# Altium footprint library Intelliclone.PcbLib: 372 footprints (part 3 of 24)
Each footprint in its own frame and in the unit in brackets; x right, y up, seen from the top. Pads: shape width x height; smd on the part's side, far side on the other; paste and mask are expansions set on the pad; w line width, h text height; cw(c..) or ccw(c..) is an arc to the next point about the centre after c.
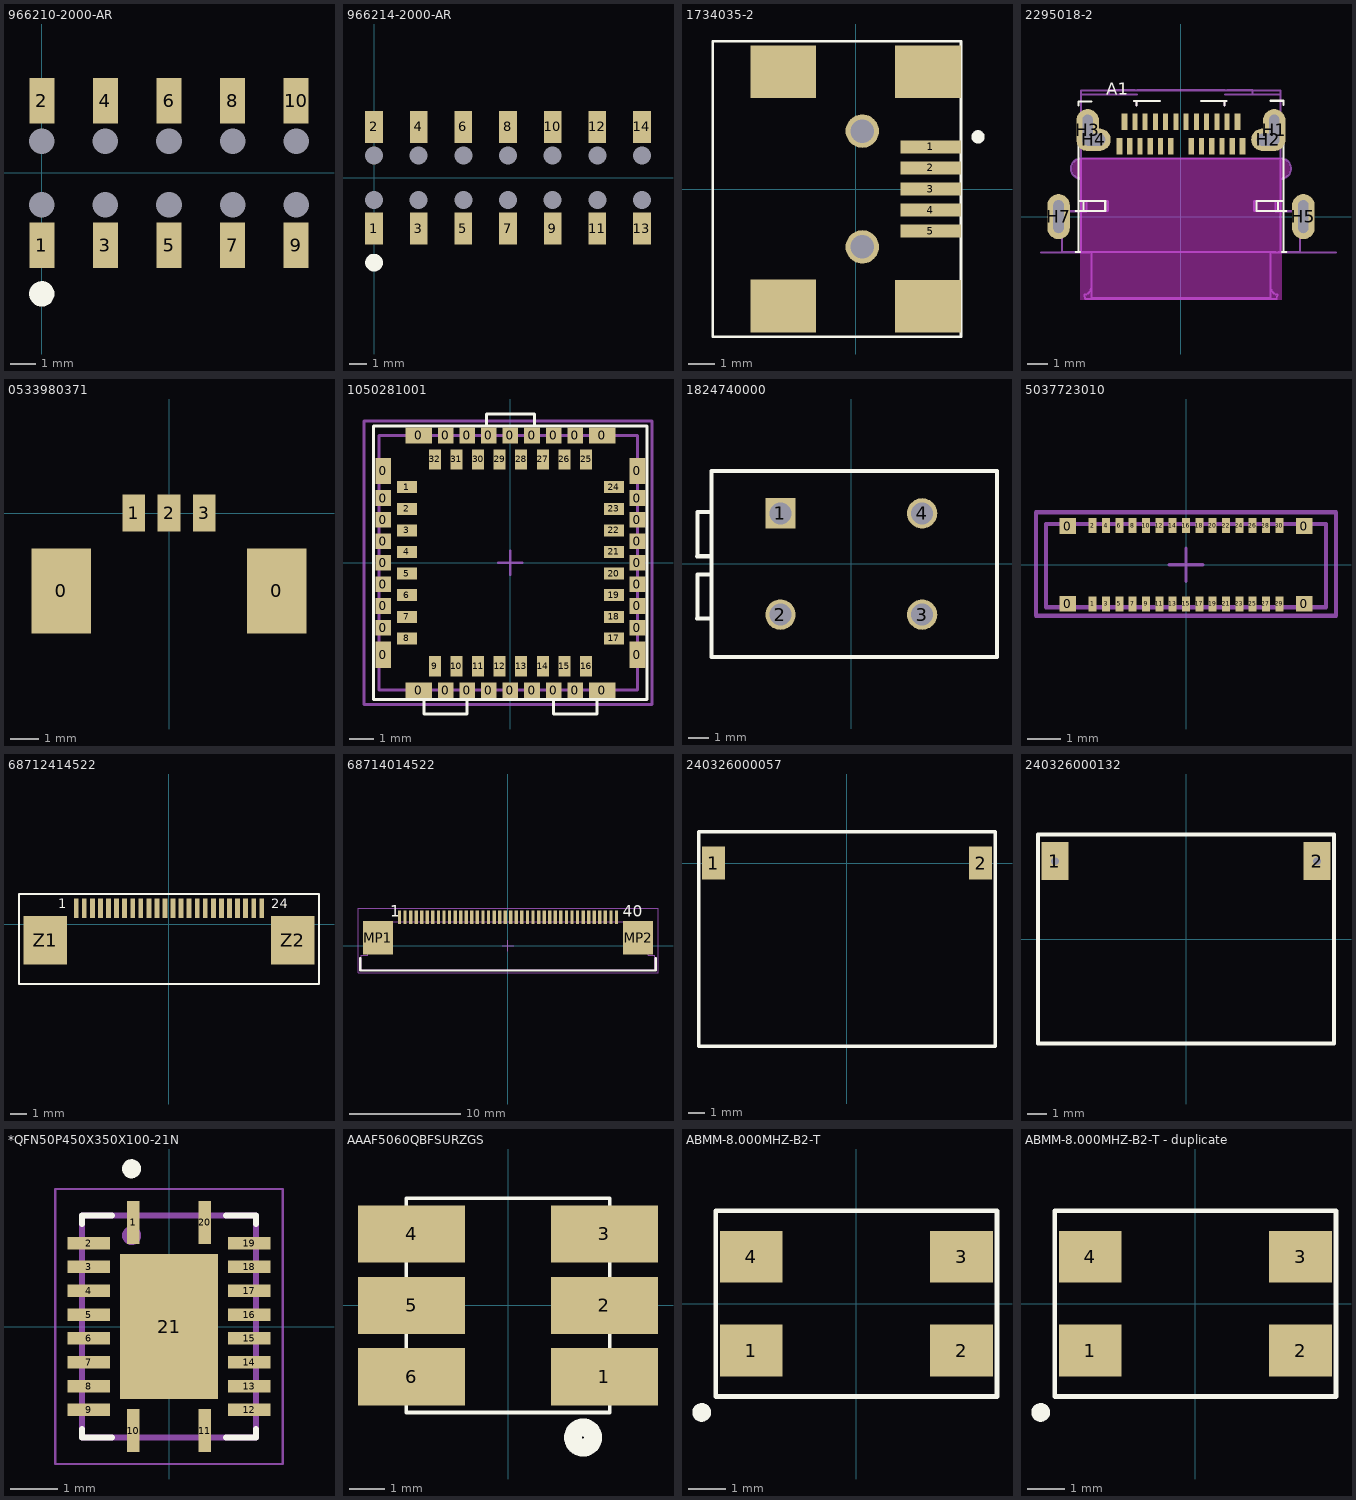
[diagram p2: the footprints below, top view; thin cyan lines are the x and y axes]

## 966210-2000-AR [mm]
pads (30):
  rect 0x0 hole 1.02 unplated: 0(0,-1.27) 0(0,-1.27) 0(0,1.27) 0(0,1.27) 0(2.54,-1.27) 0(2.54,-1.27) 0(2.54,1.27) 0(2.54,1.27) 0(5.08,-1.27) 0(5.08,-1.27) 0(5.08,1.27) 0(5.08,1.27) 0(7.62,-1.27) 0(7.62,-1.27) 0(7.62,1.27) 0(7.62,1.27) 0(10.16,-1.27) 0(10.16,-1.27) 0(10.16,1.27) 0(10.16,1.27)
  rect 1x1.82 smd: 1(0,-2.89) 2(0,2.89) 3(2.54,-2.89) 4(2.54,2.89) 5(5.08,-2.89) 6(5.08,2.89) 7(7.62,-2.89) 8(7.62,2.89) 9(10.16,-2.89) 10(10.16,2.89)
Top Overlay:
  circle w0.5: c0,-4.826 r0.254
3D body "HLE-105-02-G-DV-BE.stp": height 3.71, standoff 0.05, extent -1.27,-3.289 11.43,3.289

## 966214-2000-AR [mm]
pads (42):
  rect 0x0 hole 1.02 unplated: 0(0,-1.27) 0(0,-1.27) 0(0,1.27) 0(0,1.27) 0(2.54,-1.27) 0(2.54,-1.27) 0(2.54,1.27) 0(2.54,1.27) 0(5.08,-1.27) 0(5.08,-1.27) 0(5.08,1.27) 0(5.08,1.27) 0(7.62,-1.27) 0(7.62,-1.27) 0(7.62,1.27) 0(7.62,1.27) 0(10.16,-1.27) 0(10.16,-1.27) 0(10.16,1.27) 0(10.16,1.27) 0(12.7,-1.27) 0(12.7,-1.27) 0(12.7,1.27) 0(12.7,1.27) 0(15.24,-1.27) 0(15.24,-1.27) 0(15.24,1.27) 0(15.24,1.27)
  rect 1x1.82 smd: 1(0,-2.89) 2(0,2.89) 3(2.54,-2.89) 4(2.54,2.89) 5(5.08,-2.89) 6(5.08,2.89) 7(7.62,-2.89) 8(7.62,2.89) 9(10.16,-2.89) 10(10.16,2.89) 11(12.7,-2.89) 12(12.7,2.89) 13(15.24,-2.89) 14(15.24,2.89)
Top Overlay:
  circle w0.5: c0,-4.826 r0.254
3D body "HLE-107-02-G-DV-BE.stp": height 3.71, standoff 0.05, extent -1.27,-3.289 16.51,3.29

## 1734035-2 [mm] "USB Jack"
pads (11):
  rect 2.3x0.5 smd: 1(2.85,1.6) 2(2.85,0.8) 3(2.85,0) 4(2.85,-0.8) 5(2.85,-1.6)
  rect 2.5x2 smd: ""(-2.75,-4.445) ""(-2.75,4.45) ""(2.75,-4.45) ""(2.75,4.45)
  round 1.27 hole 0.9: ""(0.25,-2.2) ""(0.25,2.2)
Top Overlay:
  circle w0.254: c4.648,1.981 r0.127
  lines w0.102: -5.436,-5.613 -5.436,5.613 4,5.613 4,-5.613 -5.436,-5.613
3D body: height 3.91, standoff 0.1, extent -5.436,-5.613 4,5.613

## 2295018-2 [mm] "Connector, Receptacle, USB Type C, SMT"
height 2.96
pads (30):
  rect 0.3x0.8 smd: A1(-2.75,4.63) A12(2.75,4.63) B1(3,3.43) B12(-3,3.43)
  rect 0.25x0.8 smd: A2(-2.25,4.63) A3(-1.75,4.63) A4(-1.25,4.63) A5(-0.75,4.63) A6(-0.25,4.63) A7(0.25,4.63) A8(0.75,4.63) A9(1.25,4.63) A10(1.75,4.63) A11(2.25,4.63) B2(2.5,3.43) B3(2,3.43) B4(1.5,3.43) B5(1,3.43) B6(0.5,3.43) B7(-0.5,3.43) B8(-1,3.43) B9(-1.5,3.43) B10(-2,3.43) B11(-2.5,3.43)
  oval 1.1x2.05 hole 0.5 slot 1.5 at 90 deg: H1(4.55,4.22) H3(-4.55,4.22)
  oval 1.65x1.1 hole 0.6 slot 1.1 at 0 deg: H2(4.25,3.75) H4(-4.25,3.75)
  oval 1.1x2.2 hole 0.5 slot 1.6 at 90 deg: H5(5.97,0) H7(-5.97,0)
Top Overlay:
  lines w0.1: -5.143,-1.735 -4.993,-1.735 ; -5.143,0.265 -4.993,0.265 ; -4.993,0.24 -4.993,3.54 ; -4.993,0.765 -3.693,0.765 -3.693,0.265 -4.993,0.265 ; -4.993,5.41 -4.993,5.625 -4.373,5.625 ; -4.923,-1.735 -4.993,-1.735 ; -4.743,0.265 -4.743,0.765 ; -2.277,5.632 -2.165,5.632 ; -2.165,5.422 -2.165,5.632 ; -1.025,5.632 -2.165,5.632 ; 0.975,5.632 2.115,5.632 ; 2.115,5.422 2.115,5.632 ; 2.226,5.632 2.115,5.632 ; 4.373,5.65 4.993,5.65 4.993,5.435 ; 4.743,0.265 4.743,0.765 ; 4.923,-1.735 4.993,-1.735 ; 4.993,0.765 3.693,0.765 3.693,0.265 4.993,0.265 ; 4.993,0.24 4.993,3.54 ; 5.143,-1.735 4.993,-1.735 ; 5.143,0.265 4.993,0.265 ; -4.993,-1.735 -4.993,0.265 ; 4.993,-1.735 4.993,0.265
  text "A1" at -3.632,5.74 h1.02
Keep-Out Layer:
  board cut-out: -4.92,-4.064 -4.92,1.856 -5.008,1.879 -5.158,1.984 -5.261,2.135 -5.304,2.312 -5.281,2.493 -5.195,2.655 -5.058,2.776 -4.887,2.84 -4.796,2.84 4.796,2.84 4.887,2.84 5.058,2.776 5.195,2.655 5.281,2.493 5.304,2.312 5.261,2.135 5.158,1.984 5.008,1.879 4.92,1.856 4.92,-4.064
Mechanical 1:
  lines w0.1: -6.823,-1.753 -4.866,-1.753 -4.866,1.84 cw(c-4.866,2.34) -4.866,2.84 4.866,2.84 cw(c4.866,2.34) 4.866,1.84 4.866,-1.753 7.562,-1.753
Mechanical 5:
  lines w0.1: -4.866,0.24 -4.866,6.14 0,6.14 4.866,6.14 4.866,0.24 ; -4.866,-1.735 -4.866,0.265 -3.566,0.265 -3.566,0.765 -4.866,0.765 -4.866,5.955 -3.32,5.955 -2.14,5.955 ; -4.62,0.24 -5.8,0.24 -5.8,-1.76 -4.37,-1.76 -4.37,-3.418 cw(c-4.77,-3.418) -4.703,-3.813 -4.67,-4.01 -3.17,-4.01 0,-4.01 3.17,-4.01 4.67,-4.01 4.703,-3.813 cw(c4.77,-3.418) 4.37,-3.418 4.37,-1.76 5.8,-1.76 ; -4.62,0.265 -4.77,0.265 -5.5,0.265 -5.8,0.265 -5.8,-1.735 -5.5,-1.735 -4.77,-1.735 -4.62,-1.735 -3.32,-1.735 3.32,-1.735 4.62,-1.735 ; -4.616,0.265 -4.616,0.765 ; -4.37,-1.735 -4.37,-3.983 -3.17,-3.983 3.17,-3.983 4.37,-3.983 4.37,-1.735 ; -3.374,5.955 -3.374,5.965 -3.461,5.965 -3.5,5.965 -3.5,6.165 -3.461,6.165 -3.124,6.165 -3.051,6.165 -2.252,6.165 ; -2.277,5.632 -2.165,5.632 -2.165,5.422 ; -2.14,6.165 2.14,6.165 ; 2.115,5.422 2.115,5.632 2.226,5.632 ; 2.14,5.955 3.32,5.955 4.866,5.955 4.866,0.765 3.566,0.765 3.566,0.265 4.866,0.265 ; 2.252,6.165 3.051,6.165 3.124,6.165 3.461,6.165 3.5,6.165 3.5,5.965 3.461,5.965 3.374,5.965 3.374,5.955 ; 4.616,0.265 4.616,0.765 ; 4.636,0.24 5.816,0.24 5.816,-1.76 ; 4.77,-1.735 5.5,-1.735 5.8,-1.735 5.8,0.265 5.5,0.265 4.77,0.265 ; 5.016,-1.735 4.866,-1.735 4.866,0.265 ; 5.016,0.265 4.866,0.265
Mechanical 14:
  lines w0.076: -4.869,1.834 cw(c-4.866,2.337) -4.869,2.84 ; -4.866,-1.753 -4.866,1.84 ; -4.55,2.84 4.55,2.84 ; 4.866,-1.753 4.866,1.84 ; 4.869,1.84 ccw(c4.866,2.337) 4.918,2.831
3D body "c-2295018-2-1-3d.stp": height 2.45, standoff -1.15, extent -6.095,-3.22 6.045,4.875

## 0533980371 [mm] "CONN HEADER 3POS 1.25MM VERT SMD"
pads (5):
  rect 2.1x3 smd: 0(-3.8,-2.75) 0(3.8,-2.75)
  rect 0.8x1.3 smd: 1(-1.25,0) 2(0,0) 3(1.25,0)
3D body "533980371.stp": height 4.5, standoff -0.2, extent -4.45,-4.15 4.45,0.05

## 1050281001 [mm] "Molex Camera Module Socket"
height 4.2
pads (68):
  rect 0.65x1.1 smd: 0(-5.305,-3.825) 0(-5.305,3.825) 0(5.295,-3.825) 0(5.295,3.825)
  rect 0.65x0.65 smd: 0(-5.305,-2.7) 0(-5.305,-1.8) 0(-5.305,-0.9) 0(-5.305,0) 0(-5.305,0.9) 0(-5.305,1.8) 0(-5.305,2.7) 0(-2.7,-5.305) 0(-2.7,5.305) 0(-1.8,-5.305) 0(-1.8,5.305) 0(-0.9,-5.305) 0(-0.9,5.305) 0(0,-5.305) 0(0,5.305) 0(0.9,-5.305) 0(0.9,5.305) 0(1.8,-5.305) 0(1.8,5.305) 0(2.7,-5.305) 0(2.7,5.305) 0(5.295,-2.7) 0(5.295,-1.8) 0(5.295,-0.9) 0(5.295,0) 0(5.295,0.9) 0(5.295,1.8) 0(5.295,2.7)
  rect 1.1x0.65 smd: 0(-3.825,-5.305) 0(-3.825,5.305) 0(3.825,-5.305) 0(3.825,5.305)
  rect 0.84x0.5 smd: 1(-4.31,3.15) 2(-4.31,2.25) 3(-4.31,1.35) 4(-4.31,0.45) 5(-4.31,-0.45) 6(-4.31,-1.35) 7(-4.31,-2.25) 8(-4.31,-3.15) 17(4.31,-3.15) 18(4.31,-2.25) 19(4.31,-1.35) 20(4.31,-0.45) 21(4.31,0.45) 22(4.31,1.35) 23(4.31,2.25) 24(4.31,3.15)
  rect 0.5x0.84 smd: 9(-3.15,-4.31) 10(-2.25,-4.31) 11(-1.35,-4.31) 12(-0.45,-4.31) 13(0.45,-4.31) 14(1.35,-4.31) 15(2.25,-4.31) 16(3.15,-4.31) 25(3.15,4.31) 26(2.25,4.31) 27(1.35,4.31) 28(0.45,4.31) 29(-0.45,4.31) 30(-1.35,4.31) 31(-2.25,4.31) 32(-3.15,4.31)
Top Overlay:
  lines w0.127: -3.6,-5.7 -3.6,-6.3 -1.8,-6.3 -1.8,-5.7 ; -1,5.7 -1,6.2 1,6.2 1,5.7 ; 1.8,-5.7 1.8,-6.3 3.6,-6.3 3.6,-5.7 ; -5.7,-5.7 -5.7,5.7 5.7,5.7 5.7,-5.7 -5.7,-5.7
Mechanical 1:
  lines w0.127: -5.48,-5.3 -5.48,5.3 5.3,5.3 5.3,-5.3 -5.48,-5.3
Mechanical 15:
  lines w0.1: -0.5,0 0.5,0 ; 0,-0.5 0,0.5
  lines w0.127: -6.1,-5.9 -6.1,5.9 5.9,5.9 5.9,-5.9 -6.1,-5.9
3D body "1050281001.stp": height 4.2, standoff 0, extent -5.48,-5.3 5.3,5.3

## 1824740000 [mm]
pads (4):
  rect 1.5x1.5 / inner rect 1.5x1.5 / far side rect 1.9x1.9 hole 1.1: 1(-3.5,2.5)
  round 1.5 / inner round 1.5 / far side round 1.9 hole 1.1: 2(-3.5,-2.5) 3(3.5,-2.5) 4(3.5,2.5)
Top Overlay:
  lines w0.2: -7.623,-2.696 -6.9,-2.696 ; -7.623,0.384 -6.9,0.384 ; -7.6,-2.673 -7.6,-0.514 -6.9,-0.514 ; -7.6,0.407 -7.6,2.566 -6.9,2.566 ; -6.9,-4.6 -6.9,4.6 7.2,4.6 7.2,-4.6 5.08,-4.6 -6.9,-4.6
3D body "2WireTerminalBlock.STEP": height 8.35, standoff -3.65, extent -7.8,-4.6 7.2,4.6

## 5037723010 [mm] "Molex Slim Stack 0.4mm"
height 0.66
pads (34):
  rect 0.5x0.47 smd: 0(-3.55,-1.165) 0(-3.55,1.165) 0(3.55,-1.165) 0(3.55,1.165)
  rect 0.24x0.45 smd: 1(-2.8,-1.175) 2(-2.8,1.175) 3(-2.4,-1.175) 4(-2.4,1.175) 5(-2,-1.175) 6(-2,1.175) 7(-1.6,-1.175) 8(-1.6,1.175) 9(-1.2,-1.175) 10(-1.2,1.175) 11(-0.8,-1.175) 12(-0.8,1.175) 13(-0.4,-1.175) 14(-0.4,1.175) 15(0,-1.175) 16(0,1.175) 17(0.4,-1.175) 18(0.4,1.175) 19(0.8,-1.175) 20(0.8,1.175) 21(1.2,-1.175) 22(1.2,1.175) 23(1.6,-1.175) 24(1.6,1.175) 25(2,-1.175) 26(2,1.175) 27(2.4,-1.175) 28(2.4,1.175) 29(2.8,-1.175) 30(2.8,1.175)
Mechanical 1:
  lines w0.127: -4.2,-1.275 -4.2,1.225 4.2,1.225 4.2,-1.275 -4.2,-1.275
Mechanical 15:
  lines w0.1: -0.5,0 0.5,0 ; 0,-0.5 0,0.5
  lines w0.127: -4.5,-1.525 4.5,-1.525 4.5,1.575 -4.5,1.575 -4.5,-1.525
3D body "5037723010.stp": height 0.64, standoff -0.02, extent -4.2,-1.275 4.2,1.225

## 68712414522 [mm] "24 pins"
height 2.1
pads (26):
  rect 0.3x1.2 smd: 1(-5.75,0.99) 2(-5.25,0.99) 3(-4.75,0.99) 4(-4.25,0.99) 5(-3.75,0.99) 6(-3.25,0.99) 7(-2.75,0.99) 8(-2.25,0.99) 9(-1.75,0.99) 10(-1.25,0.99) 11(-0.75,0.99) 12(-0.25,0.99) 13(0.25,0.99) 14(0.75,0.99) 15(1.25,0.99) 16(1.75,0.99) 17(2.25,0.99) 18(2.75,0.99) 19(3.25,0.99) 20(3.75,0.99) 21(4.25,0.99) 22(4.75,0.99) 23(5.25,0.99) 24(5.75,0.99)
  rect 2.7x3 smd: Z1(-7.68,-0.99) Z2(7.68,-0.99)
Top Overlay:
  lines w0.127: -9.3,-3.71 -9.3,1.89 9.3,1.89 9.3,-3.71 -9.3,-3.71
  text "24" at 6.35,0.771 h1.02
  text "1" at -6.858,0.771 h1.02
3D body "68712414522.stp": height 2.06, standoff -0.04, extent -9.2,-3.71 9.2,1.39

## 68714014522 [mm] "ZIF Connectors, Horizontal, Bottom Contact, pitch 0.5mm, 40p"
height 2.25
pads (42):
  rect 0.3x1.2 smd: 1(-9.75,2.56) 2(-9.25,2.56) 3(-8.75,2.56) 4(-8.25,2.56) 5(-7.75,2.56) 6(-7.25,2.56) 7(-6.75,2.56) 8(-6.25,2.56) 9(-5.75,2.56) 10(-5.25,2.56) 11(-4.75,2.56) 12(-4.25,2.56) 13(-3.75,2.56) 14(-3.25,2.56) 15(-2.75,2.56) 16(-2.25,2.56) 17(-1.75,2.56) 18(-1.25,2.56) 19(-0.75,2.56) 20(-0.25,2.56) 21(0.25,2.56) 22(0.75,2.56) 23(1.25,2.56) 24(1.75,2.56) 25(2.25,2.56) 26(2.75,2.56) 27(3.25,2.56) 28(3.75,2.56) 29(4.25,2.56) 30(4.75,2.56) 31(5.25,2.56) 32(5.75,2.56) 33(6.25,2.56) 34(6.75,2.56) 35(7.25,2.56) 36(7.75,2.56) 37(8.25,2.56) 38(8.75,2.56) 39(9.25,2.56) 40(9.75,2.56)
  rect 2.7x3 smd: MP1(-11.68,0.7) MP2(11.68,0.7)
Top Overlay:
  lines w0.2: -13.275,-1.125 -13.275,-2.225 13.275,-2.225 13.275,-1.125
  text "1" at -10.6,2.61 h1.02
  text "40" at 10.3,2.61 h1.02
Mechanical 13:
  lines w0.1: -13.2,-2.15 -13.2,-0.85 -12.6,-0.85 -12.6,2.15 12.6,2.15 12.6,-0.85 13.2,-0.85 13.2,-2.15 -13.2,-2.15
Mechanical 15:
  lines w0.05: -0.5,0 0.5,0 ; 0,-0.5 0,0.5 ; -13.475,-2.425 13.475,-2.425 13.475,3.36 -13.475,3.36 -13.475,-2.425
3D body "68714014522.stp": height 2.1, standoff 0, extent -13.2,-2.15 13.2,2.95

## 240326000057 [mm]
pads (2):
  rect 1.4x2 smd: 1(-8.1,0) 2(8.1,0)
Top Overlay:
  lines w0.2: -9,-11.1 9,-11.1 9,1.9 -9,1.9 -9,-11.1
3D body "Speaker-2403.STEP": height 4.7, standoff 0, extent -9.05,-11.1 8.95,1.9

## 240326000132 [mm] "Knowles COBRA speaker"
height 3.5
pads (2):
  rect 1.4x2 / inner round 0.7 / far side round 0.7 hole 0.4: 1(-6.9,4.1) 2(6.9,4.1)
Top Overlay:
  lines w0.2: -7.8,-5.5 7.8,-5.5 7.8,5.5 -7.8,5.5 -7.8,-5.5
3D body "Speaker-1115.STEP": height 3.5, standoff 0, extent -7.5,-5.5 8.1,5.5

## *QFN50P450X350X100-21N [mm]
pads (21):
  rect 0.26x0.9 smd: 1(-0.75,2.185) 10(-0.75,-2.185) 11(0.75,-2.185) 20(0.75,2.185)
  rect 0.9x0.26 smd: 2(-1.685,1.75) 3(-1.685,1.25) 4(-1.685,0.75) 5(-1.685,0.25) 6(-1.685,-0.25) 7(-1.685,-0.75) 8(-1.685,-1.25) 9(-1.685,-1.75) 12(1.685,-1.75) 13(1.685,-1.25) 14(1.685,-0.75) 15(1.685,-0.25) 16(1.685,0.25) 17(1.685,0.75) 18(1.685,1.25) 19(1.685,1.75)
  rect 2.05x3.05 smd: 21(0,0)
Top Overlay:
  circle w0.2: c-0.785,3.31 r0.1
  lines w0.127: -1.83,-2.15 -1.83,-2.33 -1.2,-2.33 ; -1.83,2.15 -1.83,2.33 -1.2,2.33 ; 1.2,-2.33 1.83,-2.33 1.83,-2.15 ; 1.2,2.33 1.83,2.33 1.83,2.15
Top Paste:
  region: -0.651,0.96 0.65,0.96 0.65,-0.961 -0.651,-0.961
Mechanical 4:
  circle w0.2: c-0.785,1.91 r0.1
  circle w0.2: c-0.785,1.91 r0.1
  lines w0.127: -1.83,-2.33 1.83,-2.33 ; -1.83,-2.33 -1.83,2.33 ; -1.83,-2.33 1.83,-2.33 ; -1.83,-2.33 -1.83,2.33 ; -1.83,2.33 1.83,2.33 ; -1.83,2.33 1.83,2.33 ; 1.83,-2.33 1.83,2.33 ; 1.83,-2.33 1.83,2.33
Mechanical 16:
  lines w0.05: -2.385,-2.885 2.385,-2.885 2.385,2.885 -2.385,2.885 -2.385,-2.885
3D body "User Library-PVQFN-N20 (RGY)-1.STEP": height 1, standoff 0, extent -1.81,-2.31 1.81,2.31

## AAAF5060QBFSURZGS [mm]
height 2.55
pads (6):
  rect 3x1.6 smd: 1(2.7,-2) 2(2.7,0) 3(2.7,2) 4(-2.7,2) 5(-2.7,0) 6(-2.7,-2)
Top Overlay:
  circle w0.5: c2.1,-3.7 r0.283
  lines w0.1: -2.85,-3 2.85,-3 2.85,3 -2.85,3 -2.85,-3
3D body: height 1.3, standoff 0, extent -2.5,-3 2.5,3

## ABMM-8.000MHZ-B2-T [mm]
height 2.54
pads (4):
  rect 1.7x1.4 smd: 1(-2.85,-1.27) 2(2.85,-1.27) 3(2.85,1.27) 4(-2.85,1.27)
Top Overlay:
  circle w0.254: c-4.191,-2.946 r0.127
  lines w0.127: -3.81,-2.515 3.81,-2.515 3.81,2.515 -3.81,2.515 -3.81,-2.515
3D body: height 1.27, standoff 0.1, extent -3.505,-2.515 3.505,2.515

## ABMM-8.000MHZ-B2-T - duplicate [mm]
height 2.54
pads (4):
  rect 1.7x1.4 smd: 1(-2.85,-1.27) 2(2.85,-1.27) 3(2.85,1.27) 4(-2.85,1.27)
Top Overlay:
  circle w0.254: c-4.191,-2.946 r0.127
  lines w0.127: -3.81,-2.515 3.81,-2.515 3.81,2.515 -3.81,2.515 -3.81,-2.515
3D body: height 1.27, standoff 0.1, extent -3.505,-2.515 3.505,2.515